# Altium footprint library Library.PcbLib: 298 footprints (part 14 of 19)
Each footprint in its own frame and in the unit in brackets; x right, y up, seen from the top. Pads: shape width x height; smd on the part's side, far side on the other; paste and mask are expansions set on the pad; w line width, h text height; cw(c..) or ccw(c..) is an arc to the next point about the centre after c.
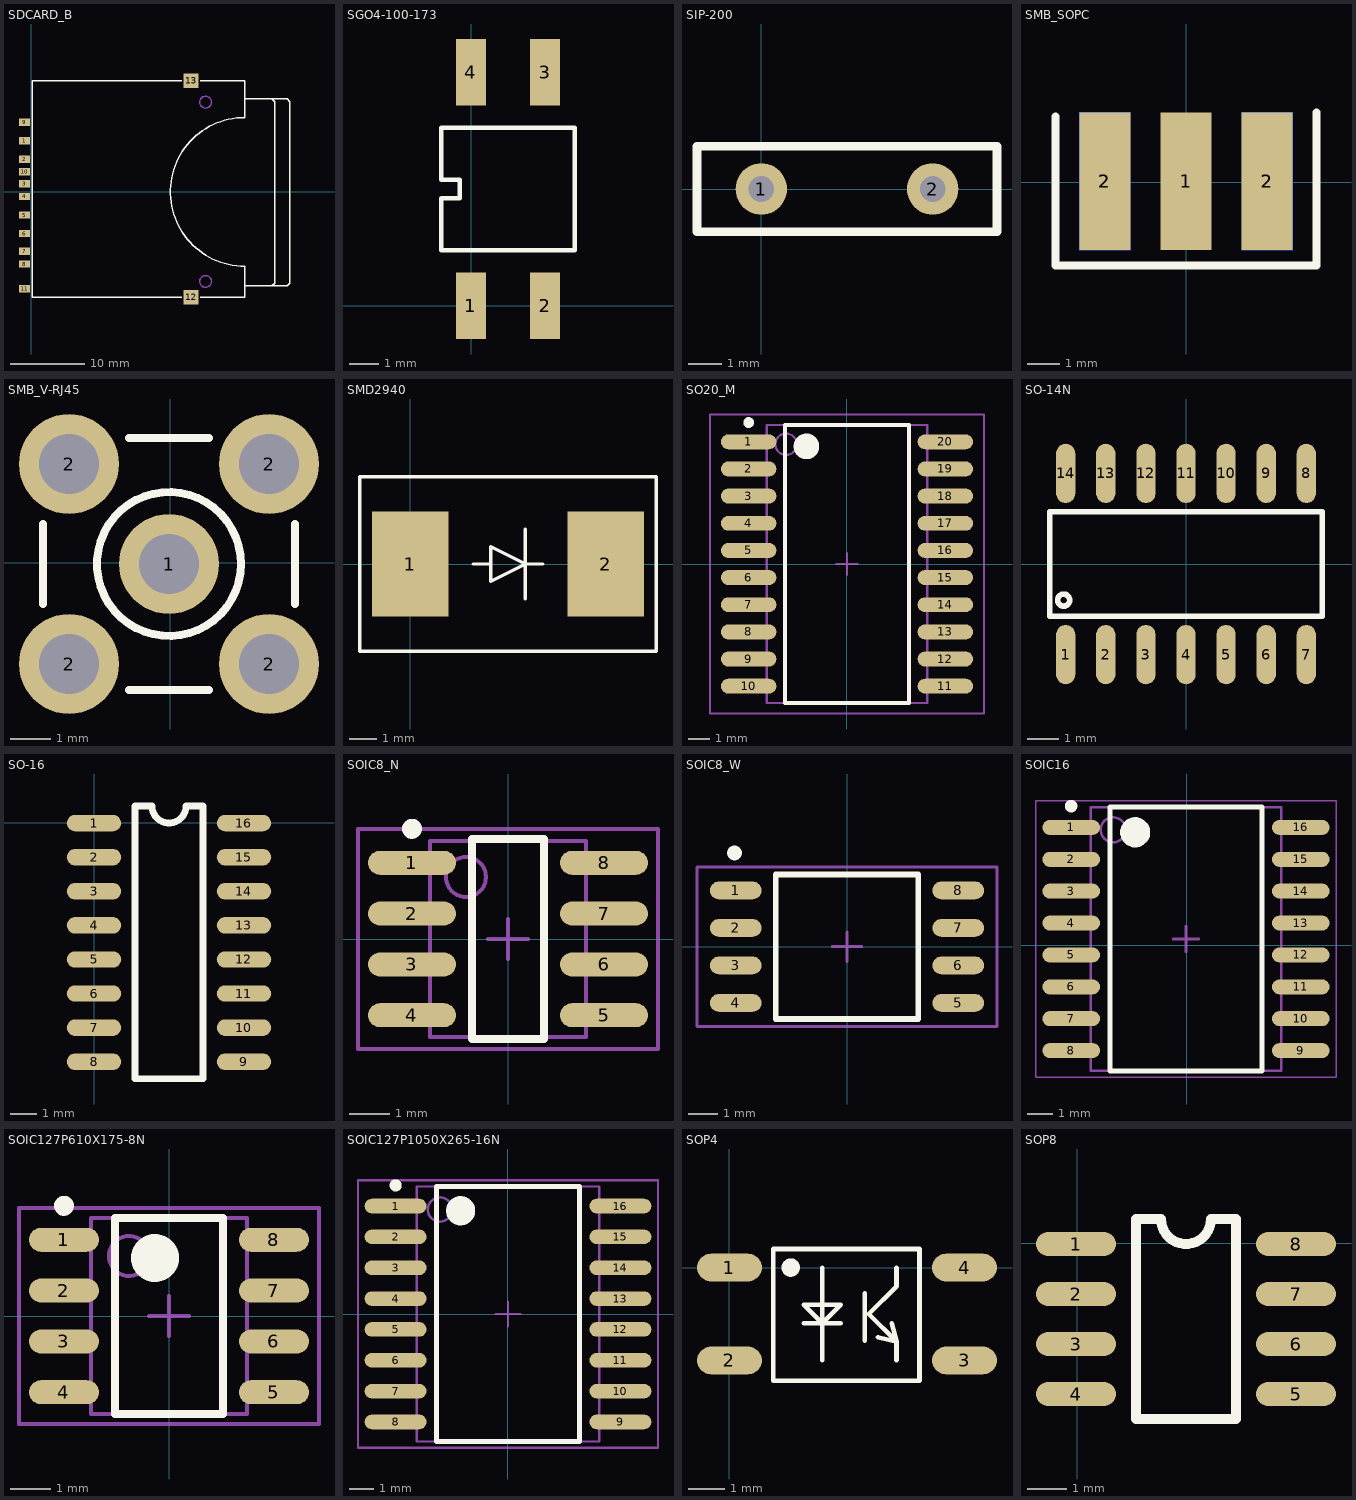
[diagram p13: the footprints below, top view; thin cyan lines are the x and y axes]

## SDCARD_B [mm] "SD卡自弹"
pads (13):
  rect 1.5x1 smd: 1(-0.889,6.88) 2(-0.889,4.38) 3(-0.889,1.08) 4(-0.889,-0.63) 5(-0.889,-3.13) 6(-0.889,-5.63) 7(-0.889,-8.05) 8(-0.889,-9.75) 9(-0.889,9.38) 10(-0.889,2.73) 11(-0.889,-13.1)
  rect 2x2 smd: 12(21.59,-14.224) 13(21.59,14.986)
Top Overlay:
  lines w0.2: 20.32,-14.224 0.127,-14.224 0.127,0 0.127,14.986 20.32,14.986 ; 22.86,-14.224 28.829,-14.224 28.829,-10.033 cw(c28.829,0) 28.829,10.033 28.829,14.986 22.86,14.986 ; 28.829,-12.7 32.893,-12.7 34.544,-12.7 34.925,-12.319 34.925,12.192 34.544,12.573 32.893,12.573 28.829,12.573 ; 32.512,-12.7 32.893,-12.319 32.893,12.192 32.512,12.573
Mechanical 1:
  circle w0.2: c23.55,-12.1 r0.8
  circle w0.2: c23.55,12.1 r0.8

## SGO4-100-173 [mil]
pads (4):
  rect 40x90 smd: 1(-0.44,0.3) 2(99.56,0.3) 3(99.56,315.3) 4(-0.44,315.3)
Top Overlay:
  lines w6: -40.44,75.3 139.56,75.3 139.56,240.3 -40.44,240.3 -40.44,170.3 -15.44,170.3 -15.44,145.3 -40.44,145.3 -40.44,75.3

## SIP-200 [mil]
pads (2):
  round 60 hole 30: 1(0,0) 2(200,0)
Top Overlay:
  lines w10: -75,-50 -75,50 275,50 275,-50 -75,-50

## SMB_SOPC [mil]
pads (5):
  rect 62.99x170 smd: 1(0,1) 2(-100,1) 2(100,1)
  rect 62.99x170 smd far side: 2(-100,1) 2(100,0.98)
Top Overlay:
  lines w10: -161,81 -161,-103 161,-103 161,86
3D body "SMA-KE.STEP": height 147.64, standoff -108.56, extent -128,-80.75 127.9,450.75

## SMB_V-RJ45 [mm]
pads (5):
  round 2.5 hole 1.5: 1(-0.025,-0.025) 2(-2.525,-2.525) 2(-2.525,2.475) 2(2.475,-2.525) 2(2.475,2.475)
Top Overlay:
  circle w0.2: c-0.025,-0.025 r1.8
  lines w0.2: -3.175,-1.025 -3.175,0.975 ; -1.025,-3.175 0.975,-3.175 ; -1.025,3.125 0.975,3.125 ; 3.125,-1.025 3.125,0.975
Mechanical 1:
  circle w0.025: c-0.025,-0.025 r0.2
  circle w0.025: c-0.025,-0.025 r1.05
  circle w0.025: c-0.025,-0.025 r1.8

## SMD2940 [mil]
pads (2):
  rect 110x150 smd: 1(0,0) 2(280,0)
Top Overlay:
  lines w5: 90,0 115,0 ; 165,-50 165,50 ; 190,0 165,0 ; 165,0 115,-25 115,25 165,0 ; -72.5,-125 -72.5,125 352.5,125 352.5,-125 -72.5,-125

## SO20_M [mm] "SOIC, 20-Leads, Body 12.8x7.5mm, Pitch 1.27mm, IPC Low Density"
height 2.65
pads (20):
  oval 2.6x0.7 smd: 1(-4.6,5.715) 2(-4.6,4.445) 3(-4.6,3.175) 4(-4.6,1.905) 5(-4.6,0.635) 6(-4.6,-0.635) 7(-4.6,-1.905) 8(-4.6,-3.175) 9(-4.6,-4.445) 10(-4.6,-5.715) 11(4.6,-5.715) 12(4.6,-4.445) 13(4.6,-3.175) 14(4.6,-1.905) 15(4.6,-0.635) 16(4.6,0.635) 17(4.6,1.905) 18(4.6,3.175) 19(4.6,4.445) 20(4.6,5.715)
Top Overlay:
  circle w0.25: c-4.6,6.615 r0.125
  circle w0.6: c-1.9,5.5 r0.3
  lines w0.2: -2.9,-6.5 -2.9,6.5 2.9,6.5 2.9,-6.5 -2.9,-6.5
Mechanical 13:
  circle w0.1: c-2.85,5.6 r0.5
  lines w0.1: -3.75,-6.5 -3.75,6.5 3.75,6.5 3.75,-6.5 -3.75,-6.5
Mechanical 15:
  lines w0.1: -0.5,0 0.5,0 ; 0,-0.5 0,0.5 ; -6.4,-7 -6.4,7 6.4,7 6.4,-7 -6.4,-7
3D body: height 2.65, standoff 0, extent -3.75,-6.5 3.75,6.5

## SO-14N [mil] "SN74LVC14"
pads (14):
  oval 24x74 smd: 1(-150,-113) 2(-100,-113) 3(-50,-113) 4(0,-113) 5(50,-113) 6(100,-113) 7(150,-113) 8(150,113) 9(100,113) 10(50,113) 11(0,113) 12(-50,113) 13(-100,113) 14(-150,113)
Top Overlay:
  circle w7: c-152.5,-45 r7.5
  lines w7: -170,-65 -170,65 170,65 170,-65 -170,-65

## SO-16 [mil] "AL26LS32"
pads (16):
  oval 80x24 smd: 1(-0.05,-0.43) 2(-0.05,-50.43) 3(-0.05,-100.43) 4(-0.05,-150.43) 5(-0.05,-200.43) 6(-0.05,-250.43) 7(-0.05,-300.43) 8(-0.05,-350.43) 9(219.95,-350.43) 10(219.95,-300.43) 11(219.95,-250.43) 12(219.95,-200.43) 13(219.95,-150.43) 14(219.95,-100.43) 15(219.95,-50.43) 16(219.95,-0.43)
Top Overlay:
  lines w10: 59.95,-375.43 159.95,-375.43 159.95,24.57 134.95,24.57 cw(c109.95,24.57) 84.95,24.57 59.95,24.57 59.95,-375.43

## SOIC8_N [mm] "8-Pin Small Outline Integrated Circuit Package (SOIC8), IPC Medium Density"
height 1.75
pads (8):
  oval 2.2x0.6 smd: 1(-2.4,1.905) 2(-2.4,0.635) 3(-2.4,-0.635) 4(-2.4,-1.905) 5(2.4,-1.905) 6(2.4,-0.635) 7(2.4,0.635) 8(2.4,1.905)
Top Overlay:
  circle w0.25: c-2.4,2.755 r0.125
  lines w0.2: -0.9,-2.5 -0.9,2.5 0.9,2.5 0.9,-2.5 -0.9,-2.5
Mechanical 13:
  circle w0.1: c-1.05,1.55 r0.5
  lines w0.1: -1.95,-2.45 -1.95,2.45 1.95,2.45 1.95,-2.45 -1.95,-2.45
Mechanical 15:
  lines w0.1: -0.5,0 0.5,0 ; 0,-0.5 0,0.5 ; -3.75,-2.75 3.75,-2.75 3.75,2.75 -3.75,2.75 -3.75,-2.75
3D body "SO-8.STEP": height 1.7, standoff 0, extent -3,-2.45 3,2.45

## SOIC8_W [mm] "SPI_FLASH"
height 1.75
pads (8):
  oval 1.75x0.6 smd: 1(-3.768,1.905) 2(-3.768,0.635) 3(-3.768,-0.635) 4(-3.768,-1.905) 5(3.768,-1.905) 6(3.768,-0.635) 7(3.768,0.635) 8(3.768,1.905)
Top Overlay:
  circle w0.25: c-3.808,3.175 r0.125
  lines w0.2: -2.413,-2.45 2.413,-2.45 2.413,2.45 -2.413,2.45 -2.413,-2.45
Mechanical 15:
  lines w0.1: -0.5,0 0.5,0 ; 0,-0.5 0,0.5 ; -5.08,-2.7 5.08,-2.7 5.08,2.7 -5.08,2.7 -5.08,-2.7
3D body "SOIC8.STEP": height 2.3, standoff -0.02, extent -4.222,-2.69 4.171,2.69

## SOIC16 [mm] "SOIC, 16-Leads, Body 10.30x7.50mm, Pitch 1.27mm, IPC Medium Density"
height 2.65
pads (16):
  oval 2.3x0.6 smd: 1(-4.6,4.699) 2(-4.6,3.429) 3(-4.6,2.159) 4(-4.6,0.889) 5(-4.6,-0.381) 6(-4.6,-1.651) 7(-4.6,-2.921) 8(-4.6,-4.191) 9(4.55,-4.191) 10(4.55,-2.921) 11(4.55,-1.651) 12(4.55,-0.381) 13(4.55,0.889) 14(4.55,2.159) 15(4.55,3.429) 16(4.55,4.699)
Top Overlay:
  circle w0.6: c-2.05,4.504 r0.3
  circle w0.25: c-4.6,5.549 r0.125
  lines w0.2: -3.05,-4.996 3,-4.996 3,5.504 -3.05,5.504 -3.05,-4.996
Mechanical 13:
  circle w0.1: c-2.925,4.604 r0.5
  lines w0.1: -3.825,-4.996 3.775,-4.996 3.775,5.504 -3.825,5.504 -3.825,-4.996
Mechanical 15:
  lines w0.05: -6,-5.246 5.95,-5.246 5.95,5.754 -6,5.754 -6,-5.246
  lines w0.1: -0.525,0.254 0.475,0.254 ; -0.025,-0.246 -0.025,0.754
3D body: height 2.65, standoff 0.2, extent -3.825,-4.996 3.775,5.504

## SOIC127P610X175-8N [mm] "ACS712"
height 1.75
pads (8):
  oval 1.75x0.6 smd: 1(-2.625,1.905) 2(-2.625,0.635) 3(-2.625,-0.635) 4(-2.625,-1.905) 5(2.625,-1.905) 6(2.625,-0.635) 7(2.625,0.635) 8(2.625,1.905)
Top Overlay:
  circle w0.6: c-0.35,1.45 r0.3
  circle w0.25: c-2.625,2.755 r0.125
  lines w0.2: -1.35,-2.45 1.35,-2.45 1.35,2.45 -1.35,2.45 -1.35,-2.45
Mechanical 13:
  circle w0.1: c-1,1.5 r0.5
  lines w0.1: -1.95,-2.45 1.95,-2.45 1.95,2.45 -1.95,2.45 -1.95,-2.45
Mechanical 15:
  lines w0.1: -0.5,0 0.5,0 ; 0,-0.5 0,0.5 ; -3.75,-2.7 3.75,-2.7 3.75,2.7 -3.75,2.7 -3.75,-2.7
3D body: height 1, standoff 0.1, extent -1.95,-2.45 1.95,2.45

## SOIC127P1050X265-16N [mm] "SOIC SMB460"
height 2.65
pads (16):
  oval 2.55x0.6 smd: 1(-4.625,4.445) 2(-4.625,3.175) 3(-4.625,1.905) 4(-4.625,0.635) 5(-4.625,-0.635) 6(-4.625,-1.905) 7(-4.625,-3.175) 8(-4.625,-4.445) 9(4.625,-4.445) 10(4.625,-3.175) 11(4.625,-1.905) 12(4.625,-0.635) 13(4.625,0.635) 14(4.625,1.905) 15(4.625,3.175) 16(4.625,4.445)
Top Overlay:
  circle w0.25: c-4.625,5.295 r0.125
  circle w0.6: c-1.95,4.25 r0.3
  lines w0.2: -2.95,-5.25 -2.95,5.25 2.95,5.25 2.95,-5.25 -2.95,-5.25
Mechanical 13:
  circle w0.1: c-2.8,4.3 r0.5
  lines w0.1: -3.75,-5.25 -3.75,5.25 3.75,5.25 3.75,-5.25 -3.75,-5.25
Mechanical 15:
  lines w0.1: -0.5,0 0.5,0 ; 0,-0.5 0,0.5 ; -6.175,-5.5 -6.175,5.5 6.175,5.5 6.175,-5.5 -6.175,-5.5
3D body: height 2.65, standoff 0.1, extent -3.75,-5.25 3.75,5.25

## SOP4 [mil] "AQY211G2S"
pads (4):
  oval 70x30 smd: 1(0,0) 2(0,-100) 3(253.23,-100) 4(253.23,0)
Top Overlay:
  circle w10: c65.94,0 r4.92
  lines w5: 80,-60 120,-60 ; 100,-100 100,0 ; 145.67,-78.74 145.67,-27.56 ; 160,-75 180,-80 ; 175,-60 180,-80 ; 180,-100 180,-80 ; 180,0 180,-20 150,-50 180,-80 ; 47.24,-121.73 204.72,-121.73 204.72,20 47.24,20 47.24,-121.73 ; 80,-40 100,-60 120,-40 80,-40
3D body "User Library-HCPL-181-1.STEP": height 78.74, standoff -3.96, extent -7.87,-122.05 267.72,19.69

## SOP8 [mil]
pads (8):
  oval 80x24 smd: 1(-1,-1) 2(-1,-51) 3(-1,-101) 4(-1,-151) 5(219,-151) 6(219,-101) 7(219,-51) 8(219,-1)
Top Overlay:
  lines w10: 59,-176 59,24 84,24 ccw(c109,24) 134,24 159,24 159,-176 59,-176
3D body "SOP8.STEP": height 62.99, standoff 0, extent -8.7,-173.62 229.17,24.02